# Altium footprint library ICs.PcbLib: 191 footprints (part 12 of 12)
Each footprint in its own frame and in the unit in brackets; x right, y up, seen from the top. Pads: shape width x height; smd on the part's side, far side on the other; paste and mask are expansions set on the pad; w line width, h text height; cw(c..) or ccw(c..) is an arc to the next point about the centre after c.
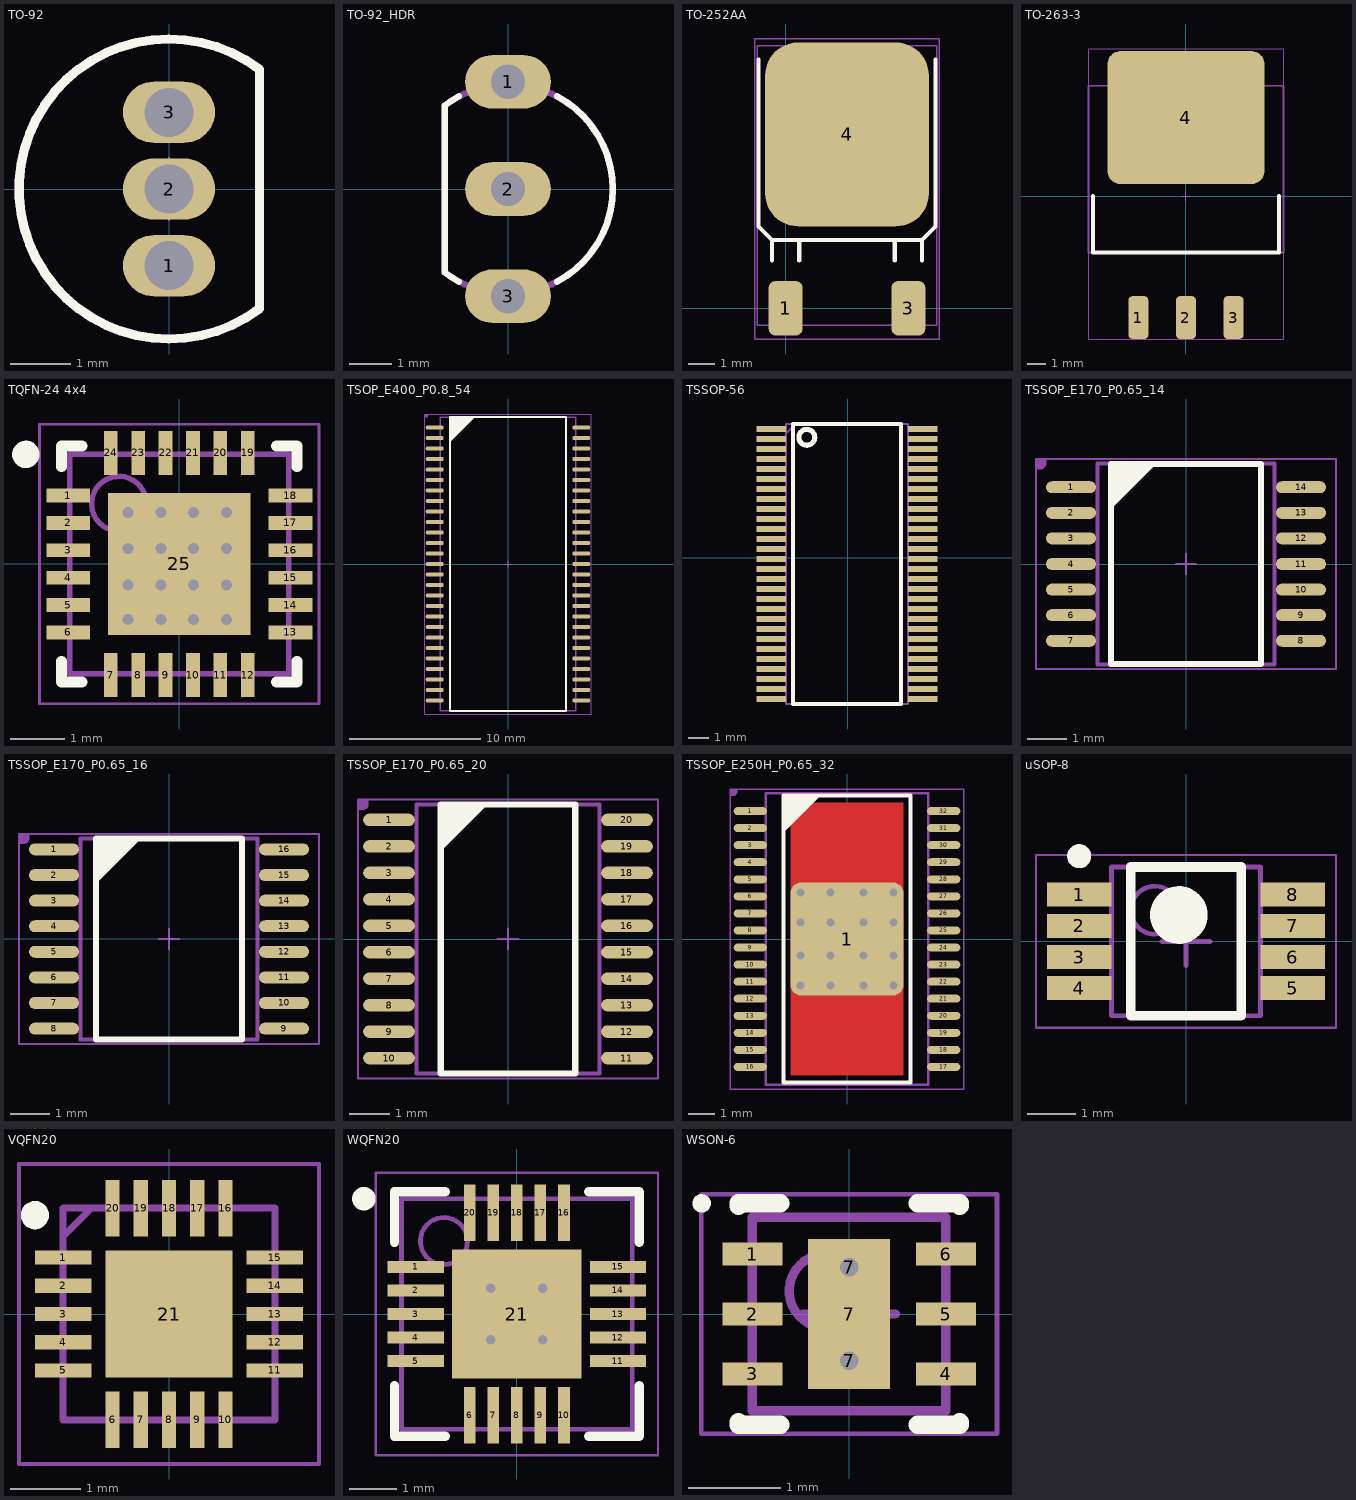
[diagram p11: the footprints below, top view; thin cyan lines are the x and y axes]

## TO-92 [mil]
pads (3):
  oval 60x40 hole 32: 1(0,-50) 2(0,0) 3(0,50)
Top Overlay:
  lines w6: 59.06,-77.95 cw(c0,0) 59.06,77.95 59.05,-77.95
Mechanical 13:
  lines w2: -10,0 10,0 ; 0,-10 0,10
  lines w6: 59.06,-77.95 cw(c0,0) 59.06,77.95 59.05,-77.95
Mechanical 15:
  lines w2: -20,0 20,0 ; 0,-20 0,20
3D body "SW3dPS-TO-92.STEP": height 405.76, standoff -228.35, extent -120,-124.1 69.37,120

## TO-92_HDR [mil]
pads (3):
  oval 80x50 hole 32: 1(0,100) 2(0,0) 3(0,-100)
Top Overlay:
  lines w6: -45.76,-86.43 cw(c0,0) -59.06,-77.95 -59.05,77.95 cw(c0,0) -45.76,86.43 ; 45.76,-86.43 ccw(c0,0) 45.76,86.43
Mechanical 13:
  lines w2: -10,0 10,0 ; 0,-10 0,10
  lines w6: -59.06,-77.95 ccw(c0,0) -59.06,77.95 -59.05,-77.95
Mechanical 15:
  lines w2: -20,0 20,0 ; 0,-20 0,20
3D body "User Library-TO-92-4.STEP": height 409.84, standoff -300, extent -60.24,-112.28 104.72,113.7

## TO-252AA [mil]
pads (3):
  rrect40% 50x80 smd: 1(0,0) 3(180,0)
  rrect40% 240x270 smd: 4(90,255)
Top Overlay:
  lines w6: -40,365 -40,120 -20,100 ; -20,70 -20,100 ; 20,70 20,100 ; 160,70 160,100 ; 200,70 200,100 ; 220,365 220,120 200,100 ; -20,100 200,100
Mechanical 13:
  lines w2: -42,-25 -42,385 222,385 222,-25 -42,-25
Mechanical 14:
  lines w2: -45,-45 225,-45 225,395 -45,395 -45,-45
3D body "TO-252.STEP": height 90.56, standoff -4.52, extent -38.73,-16.77 218.75,374.5

## TO-263-3 [mil]
height 182.68
pads (4):
  rrect40% 42x90 smd: 1(-100,-255) 2(0,-255) 3(100,-255)
  rrect20% 330x280 smd: 4(0,165)
Top Overlay:
  lines w8: -195,0 -195,-118.11 195,-118.11 195,0
Mechanical 13:
  lines w2: -10,0 10,0 ; 0,-10 0,10
  lines w4: -204.72,-118.11 204.72,-118.11 204.72,231.89 -204.72,231.89 -204.72,-118.11
Mechanical 14:
  lines w2: -205,-300 205,-300 205,310 -205,310 -205,-300
  text ".Designator" at -41,-25 h100
3D body "SW3dPS-to-263.STEP": height 184.65, standoff 0, extent -199.99,-292.88 200.01,315

## TQFN-24 4x4 [mm]
height 0.8
pads (25):
  rect 0.8x0.25 smd: 1(-2.027,1.25) 2(-2.027,0.75) 3(-2.027,0.25) 4(-2.027,-0.25) 5(-2.027,-0.75) 6(-2.027,-1.25) 13(2.027,-1.25) 14(2.027,-0.75) 15(2.027,-0.25) 16(2.027,0.25) 17(2.027,0.75) 18(2.027,1.25)
  rect 0.25x0.8 smd: 7(-1.25,-2.027) 8(-0.75,-2.027) 9(-0.25,-2.027) 10(0.25,-2.027) 11(0.75,-2.027) 12(1.25,-2.027) 19(1.25,2.027) 20(0.75,2.027) 21(0.25,2.027) 22(-0.25,2.027) 23(-0.75,2.027) 24(-1.25,2.027)
  rect 2.6x2.6 smd: 25(0,0)
via -0.936,-1.016 diameter 0.4 hole 0.2
via -0.336,-1.016 diameter 0.4 hole 0.2
via 0.264,-1.016 diameter 0.4 hole 0.2
via 0.864,-1.016 diameter 0.4 hole 0.2
via -0.936,-0.381 diameter 0.4 hole 0.2
via -0.336,-0.381 diameter 0.4 hole 0.2
via 0.264,-0.381 diameter 0.4 hole 0.2
via 0.864,-0.381 diameter 0.4 hole 0.2
via -0.936,0.279 diameter 0.4 hole 0.2
via -0.336,0.279 diameter 0.4 hole 0.2
via 0.264,0.279 diameter 0.4 hole 0.2
via 0.864,0.279 diameter 0.4 hole 0.2
via 0.864,0.94 diameter 0.4 hole 0.2
via 0.264,0.94 diameter 0.4 hole 0.2
via -0.336,0.94 diameter 0.4 hole 0.2
via -0.936,0.94 diameter 0.4 hole 0.2
Top Overlay:
  circle w0.25: c-2.8,2 r0.125
  lines w0.2: -2.15,-1.775 -2.15,-2.15 -1.775,-2.15 ; -2.15,1.775 -2.15,2.15 -1.775,2.15 ; 1.775,-2.15 2.15,-2.15 2.15,-1.775 ; 1.775,2.15 2.15,2.15 2.15,1.775
Mechanical 13:
  circle w0.1: c-1.1,1.1 r0.5
  lines w0.1: -2,-2 2,-2 2,2 -2,2 -2,-2
Mechanical 15:
  lines w0.05: -2.55,-2.55 2.55,-2.55 2.55,2.55 -2.55,2.55 -2.55,-2.55
  lines w0.1: -0.5,0 0.5,0 ; 0,-0.5 0,0.5
3D body "TQFN-24 4x4.step": height 0.8, standoff 0, extent -2.01,-2.01 2.01,2.01

## TSOP_E400_P0.8_54 [mil]
height 47.24
pads (54):
  oval 54x12 smd: 1(-220,409.45) 2(-220,377.95) 3(-220,346.46) 4(-220,314.96) 5(-220,283.46) 6(-220,251.97) 7(-220,220.47) 8(-220,188.98) 9(-220,157.48) 10(-220,125.98) 11(-220,94.49) 12(-220,62.99) 13(-220,31.5) 14(-220,0) 15(-220,-31.5) 16(-220,-62.99) 17(-220,-94.49) 18(-220,-125.98) 19(-220,-157.48) 20(-220,-188.98) 21(-220,-220.47) 22(-220,-251.97) 23(-220,-283.47) 24(-220,-314.96) 25(-220,-346.46) 26(-220,-377.95) 27(-220,-409.45) 28(220,-409.45) 29(220,-377.95) 30(220,-346.46) 31(220,-314.96) 32(220,-283.47) 33(220,-251.97) 34(220,-220.47) 35(220,-188.98) 36(220,-157.48) 37(220,-125.98) 38(220,-94.49) 39(220,-62.99) 40(220,-31.5) 41(220,0) 42(220,31.5) 43(220,62.99) 44(220,94.49) 45(220,125.98) 46(220,157.48) 47(220,188.98) 48(220,220.47) 49(220,251.97) 50(220,283.46) 51(220,314.96) 52(220,346.46) 53(220,377.95) 54(220,409.45)
Top Overlay:
  region: -174.21,440.94 -99.06,440.94 -174.21,365.79
  lines w6: -174.21,-440.94 174.21,-440.94 174.21,440.94 -174.21,440.94 -174.21,-440.94
Mechanical 13:
  lines w2: -10,0 10,0 ; 0,-10 0,10
  lines w4: -202.76,-440.94 202.76,-440.94 202.76,440.94 -202.76,440.94 -202.76,-440.94
Mechanical 14:
  region: -250,450 -240,450 -240,445 -240,444.01 -240.76,442.17 -242.17,440.76 -244.01,440 -245,440 -250,440
  lines w2: -250,-450 -250,450 250,450 250,-450 -250,-450
  text ".Designator" at -41,-25 h100
3D body "SW3dPS-TSOP2-54.STEP": height 51, standoff -15.9, extent -231.5,-437.8 231.5,437

## TSSOP-56 [mm]
pads (56):
  rect 1.475x0.3 smd: 1(-3.813,6.445) 2(-3.813,5.945) 3(-3.813,5.445) 4(-3.813,4.945) 5(-3.813,4.445) 6(-3.813,3.945) 7(-3.813,3.445) 8(-3.813,2.945) 9(-3.813,2.445) 10(-3.813,1.945) 11(-3.813,1.445) 12(-3.813,0.945) 13(-3.813,0.445) 14(-3.813,-0.055) 15(-3.813,-0.555) 16(-3.813,-1.055) 17(-3.813,-1.555) 18(-3.813,-2.055) 19(-3.813,-2.555) 20(-3.813,-3.055) 21(-3.813,-3.555) 22(-3.813,-4.055) 23(-3.813,-4.555) 24(-3.813,-5.055) 25(-3.813,-5.555) 26(-3.813,-6.055) 27(-3.813,-6.555) 28(-3.813,-7.055) 29(3.763,-7.055) 30(3.763,-6.555) 31(3.763,-6.055) 32(3.763,-5.555) 33(3.763,-5.055) 34(3.763,-4.555) 35(3.763,-4.055) 36(3.763,-3.555) 37(3.763,-3.055) 38(3.763,-2.555) 39(3.763,-2.055) 40(3.763,-1.555) 41(3.763,-1.055) 42(3.763,-0.555) 43(3.763,-0.055) 44(3.763,0.445) 45(3.763,0.945) 46(3.763,1.445) 47(3.763,1.945) 48(3.763,2.445) 49(3.763,2.945) 50(3.763,3.445) 51(3.763,3.945) 52(3.763,4.445) 53(3.763,4.945) 54(3.763,5.445) 55(3.763,5.945) 56(3.763,6.445)
Top Overlay:
  circle w0.254: c-2.032,6.02 r0.397
  lines w0.2: -2.725,-7.305 2.675,-7.305 2.675,6.695 -2.725,6.695 -2.725,-7.305
Mechanical 15:
  lines w0.1: -3.075,6.195 -2.575,6.695 ; -3.075,-7.305 3.025,-7.305 3.025,6.695 -3.075,6.695 -3.075,-7.305
3D body "DS90CF384AMTD_NOPB.stp": height 1.2, standoff 0, extent -4.05,-7.315 4.05,6.685

## TSSOP_E170_P0.65_14 [mil]
height 47.24
pads (14):
  oval 50x12 smd: 1(-115,76.77) 2(-115,51.18) 3(-115,25.59) 4(-115,0) 5(-115,-25.59) 6(-115,-51.18) 7(-115,-76.77) 8(115,-76.77) 9(115,-51.18) 10(115,-25.59) 11(115,0) 12(115,25.59) 13(115,51.18) 14(115,76.77)
Top Overlay:
  region: -75,100.47 -30,100.47 -75,55.47
  lines w6: -75,-100 75,-100 75,100 -75,100 -75,-100
Mechanical 13:
  lines w2: -10,0 10,0 ; 0,-10 0,10
  lines w3.94: -88.58,-100.39 88.58,-100.39 88.58,100.39 -88.58,100.39 -88.58,-100.39
Mechanical 14:
  region: -150,105 -140,105 -140,100 -140,99.01 -140.76,97.17 -142.17,95.76 -144.01,95 -145,95 -150,95
  lines w2: -150,-105 -150,105 150,105 150,-105 -150,-105
  text ".Designator" at -41,-25 h100
3D body "User Library-tssop14-2.STEP": height 47.24, standoff 0, extent -125.98,-100.39 125.99,100.4

## TSSOP_E170_P0.65_16 [mil]
height 47.24
pads (16):
  oval 50x12 smd: 1(-115,89.57) 2(-115,63.98) 3(-115,38.39) 4(-115,12.8) 5(-115,-12.8) 6(-115,-38.39) 7(-115,-63.98) 8(-115,-89.57) 9(115,-89.57) 10(115,-63.98) 11(115,-38.39) 12(115,-12.8) 13(115,12.8) 14(115,38.39) 15(115,63.98) 16(115,89.57)
Top Overlay:
  region: -72.83,100.87 -27.83,100.87 -72.83,55.87
  lines w6: -72.83,-100.39 -72.83,100.39 72.83,100.39 72.83,-100.39 -72.83,-100.39
Mechanical 13:
  lines w2: -10,0 10,0 ; 0,-10 0,10
  lines w3.94: -88.58,-100.39 -88.58,100.39 88.58,100.39 88.58,-100.39 -88.58,-100.39
Mechanical 14:
  region: -150,105 -140,105 -140,100 -140,99.01 -140.76,97.17 -142.17,95.76 -144.01,95 -145,95 -150,95
  lines w2: -150,-105 -150,105 150,105 150,-105 -150,-105
  text ".Designator" at -41,-25 h100
3D body "User Library-tssop16-2.STEP": height 47.24, standoff 0, extent -125.98,-100.39 125.99,100.4

## TSSOP_E170_P0.65_20 [mil]
height 47.24
pads (20):
  oval 50x12 smd: 1(-115,115.16) 2(-115,89.57) 3(-115,63.98) 4(-115,38.39) 5(-115,12.8) 6(-115,-12.8) 7(-115,-38.39) 8(-115,-63.98) 9(-115,-89.57) 10(-115,-115.16) 11(115,-115.16) 12(115,-89.57) 13(115,-63.98) 14(115,-38.39) 15(115,-12.8) 16(115,12.8) 17(115,38.39) 18(115,63.98) 19(115,89.57) 20(115,115.16)
Top Overlay:
  region: -65,130 -20,130 -65,85
  lines w6: -65,-130 65,-130 65,130 -65,130 -65,-130
Mechanical 13:
  lines w2: -10,0 10,0 ; 0,-10 0,10
  lines w3.94: -88.58,-129.92 88.58,-129.92 88.58,129.92 -88.58,129.92 -88.58,-129.92
Mechanical 14:
  region: -145,135 -135,135 -135,130 -135,129.01 -135.76,127.17 -137.17,125.76 -139.01,125 -140,125 -145,125
  lines w2: -145,-135 -145,135 145,135 145,-135 -145,-135
  text ".Designator" at -41,-25 h100
3D body "User Library-TSSOP-20 6_6x4_4.STEP": height 41.69, standoff -1.62, extent -125.98,-129.91 125.99,129.93

## TSSOP_E250H_P0.65_32 [mil]
height 47.24
pads (33):
  oval 50x12 smd: 1(-145,191.93) 2(-145,166.34) 3(-145,140.75) 4(-145,115.16) 5(-145,89.57) 6(-145,63.98) 7(-145,38.39) 8(-145,12.8) 9(-145,-12.8) 10(-145,-38.39) 11(-145,-63.98) 12(-145,-89.57) 13(-145,-115.16) 14(-145,-140.75) 15(-145,-166.34) 16(-145,-191.93) 17(145,-191.93) 18(145,-166.34) 19(145,-140.75) 20(145,-115.16) 21(145,-89.57) 22(145,-63.98) 23(145,-38.39) 24(145,-12.8) 25(145,12.8) 26(145,38.39) 27(145,63.98) 28(145,89.57) 29(145,115.16) 30(145,140.75) 31(145,166.34) 32(145,191.93)
  rrect20% 170x170 smd: 1(0,0)
via 70,70 diameter 24 hole 12
via -70,70 diameter 24 hole 12
via 25,70 diameter 24 hole 12
via -25,70 diameter 24 hole 12
via -25,25 diameter 24 hole 12
via 25,25 diameter 24 hole 12
via -70,25 diameter 24 hole 12
via 70,25 diameter 24 hole 12
via -70,-25 diameter 24 hole 12
via 70,-25 diameter 24 hole 12
via -25,-25 diameter 24 hole 12
via 25,-25 diameter 24 hole 12
via 25,-70 diameter 24 hole 12
via -25,-70 diameter 24 hole 12
via 70,-70 diameter 24 hole 12
via -70,-70 diameter 24 hole 12
Top Layer:
  rectangle: -85,-205 85,205
Top Overlay:
  region: -95,215 -40,215 -95,160
  lines w6: -95,-215 -95,215 95,215 95,-215 -95,-215
Mechanical 13:
  lines w2: -10,0 10,0 ; 0,-10 0,10
  lines w3.94: -122.05,-218.5 -122.05,218.5 122.05,218.5 122.05,-218.5 -122.05,-218.5
Mechanical 14:
  region: -175,225 -165,225 -165,220 -165,219.01 -165.76,217.17 -167.17,215.76 -169.01,215 -170,215 -175,215
  lines w2: -175,-225 -175,225 175,225 175,-225 -175,-225
  text ".Designator" at -41,-25 h100
3D body "SW3dPS-SSOP30-P065.STEP": height 43.26, standoff -1.57, extent -157.48,-180.79 157.48,207

## uSOP-8 [mm]
height 1
pads (8):
  rect 1.35x0.5 smd: 1(-2.225,0.975) 2(-2.225,0.325) 3(-2.225,-0.325) 4(-2.225,-0.975) 5(2.225,-0.975) 6(2.225,-0.325) 7(2.225,0.325) 8(2.225,0.975)
Top Overlay:
  circle w0.25: c-2.225,1.775 r0.125
  circle w0.6: c-0.15,0.55 r0.3
  lines w0.2: -1.15,-1.55 -1.15,1.55 1.15,1.55 1.15,-1.55 -1.15,-1.55
Mechanical 13:
  circle w0.1: c-0.65,0.65 r0.5
  lines w0.1: -1.55,-1.55 -1.55,1.55 1.55,1.55 1.55,-1.55 -1.55,-1.55
Mechanical 15:
  lines w0.05: -3.125,-1.8 -3.125,1.8 3.125,1.8 3.125,-1.8 -3.125,-1.8
  lines w0.1: -0.5,0 0.5,0 ; 0,-0.5 0,0.5
3D body "uSOP-8.step": height 1, standoff 0, extent -2.438,-1.55 2.438,1.55

## VQFN20 [mm]
pads (21):
  rect 0.8x0.2 smd: 1(-1.5,0.8) 2(-1.5,0.4) 3(-1.5,0) 4(-1.5,-0.4) 5(-1.5,-0.8) 11(1.5,-0.8) 12(1.5,-0.4) 13(1.5,0) 14(1.5,0.4) 15(1.5,0.8)
  rect 0.2x0.8 smd: 6(-0.8,-1.5) 7(-0.4,-1.5) 8(0,-1.5) 9(0.4,-1.5) 10(0.8,-1.5) 16(0.8,1.5) 17(0.4,1.5) 18(0,1.5) 19(-0.4,1.5) 20(-0.8,1.5)
  rrect0% 1.8x1.8 smd: 21(0,0)
Top Overlay:
  circle w0.2: c-1.9,1.4 r0.1
Mechanical 15:
  lines w0.1: -1.5,1.1 -1.1,1.5 ; -1.5,-1.5 -1.5,1.5 1.5,1.5 1.5,-1.5 -1.5,-1.5
Mechanical 20:
  lines w0.05: -2.125,-2.125 -2.125,2.125 2.125,2.125 2.125,-2.125 -2.125,-2.125

## WQFN20 [mm]
height 0.75
pads (21):
  rect 1.2x0.25 smd: 1(-2.15,1) 2(-2.15,0.5) 3(-2.15,0) 4(-2.15,-0.5) 5(-2.15,-1) 11(2.15,-1) 12(2.15,-0.5) 13(2.15,0) 14(2.15,0.5) 15(2.15,1)
  rect 0.25x1.2 smd: 6(-1,-2.15) 7(-0.5,-2.15) 8(0,-2.15) 9(0.5,-2.15) 10(1,-2.15) 16(1,2.15) 17(0.5,2.15) 18(0,2.15) 19(-0.5,2.15) 20(-1,2.15)
  rect 2.75x2.75 smd: 21(0,0)
via 0.55,-0.55 diameter 0.5 hole 0.2
via -0.55,-0.55 diameter 0.5 hole 0.2
via 0.55,0.55 diameter 0.5 hole 0.2
via -0.55,0.55 diameter 0.5 hole 0.2
Top Overlay:
  circle w0.25: c-3.25,2.45 r0.125
  lines w0.2: -2.6,-1.525 -2.6,-2.6 -1.525,-2.6 ; -2.6,1.525 -2.6,2.6 -1.525,2.6 ; 1.525,-2.6 2.6,-2.6 2.6,-1.525 ; 1.525,2.6 2.6,2.6 2.6,1.525
Mechanical 13:
  circle w0.1: c-1.55,1.55 r0.5
  lines w0.1: -2.45,-2.45 2.45,-2.45 2.45,2.45 -2.45,2.45 -2.45,-2.45
Mechanical 15:
  lines w0.05: -3,-3 3,-3 3,3 -3,3 -3,-3
  lines w0.1: -0.5,0 0.5,0 ; 0,-0.5 0,0.5
3D body "WQFN20.step": height 0.75, standoff 0, extent -2.46,-2.46 2.46,2.46

## WSON-6 [mm]
pads (9):
  rect 0.65x0.25 smd: 1(-1.05,0.65) 2(-1.05,0) 3(-1.05,-0.65) 4(1.05,-0.65) 5(1.05,0) 6(1.05,0.65)
  round 0.4 hole 0.2: 7(0,-0.508) 7(0,0.508)
  rect 0.89x1.63 smd: 7(0,0)
Top Overlay:
  circle w0.1: c-1.6,1.2 r0.05
  lines w0.2: -1.2,-1.175 -1.2,-1.2 -0.745,-1.2 ; -1.2,1.175 -1.2,1.2 -0.745,1.2 ; 0.745,-1.2 1.2,-1.2 1.2,-1.175 ; 0.745,1.2 1.2,1.2 1.2,1.175
Mechanical 13:
  circle w0.1: c-0.25,0.25 r0.4
  lines w0.1: -1.05,-1.05 -1.05,1.05 1.05,1.05 1.05,-1.05 -1.05,-1.05
Mechanical 15:
  lines w0.05: -1.605,-1.3 -1.605,1.3 1.605,1.3 1.605,-1.3 -1.605,-1.3
  lines w0.1: -0.5,0 0.5,0 ; 0,-0.5 0,0.5
3D body "WSON(6).step": height 0.8, standoff 0, extent -1.05,-1.05 1.05,1.05